# Altium footprint library 1.03-电容.PcbLib: 224 footprints (part 3 of 14)
Each footprint in its own frame and in the unit in brackets; x right, y up, seen from the top. Pads: shape width x height; smd on the part's side, far side on the other; paste and mask are expansions set on the pad; w line width, h text height; cw(c..) or ccw(c..) is an arc to the next point about the centre after c.
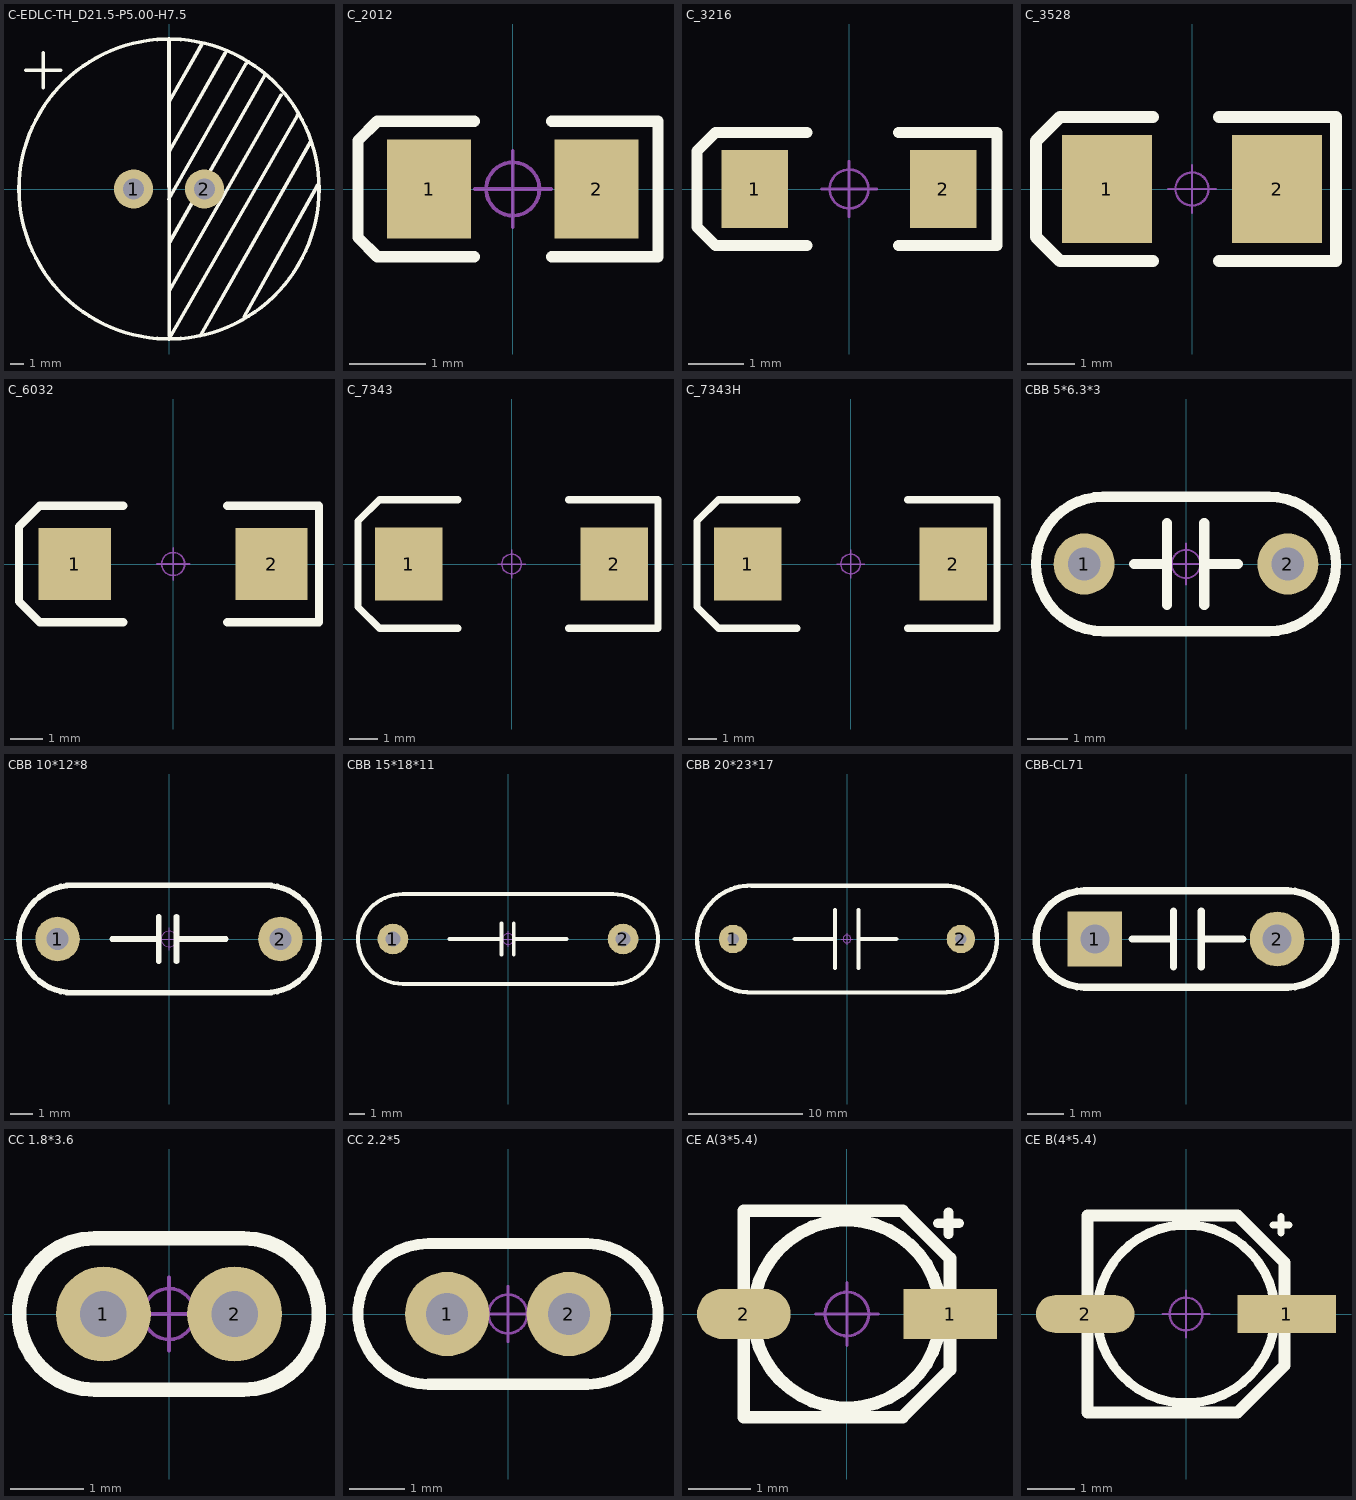
[diagram p2: the footprints below, top view; thin cyan lines are the x and y axes]

## C-EDLC-TH_D21.5-P5.00-H7.5 [mm] "双电层电容器            封装库来自淘宝卖家ID:黄晶宝石"
pads (2):
  round 2.8 hole 1.5: 1(-2.54,0) 2(2.54,0)
Top Overlay:
  circle w0.254: c0,0 r10.75
  lines w0.254: -10.25,8.5 -7.75,8.5 ; -9,7.25 -9,9.75 ; -0.026,-0.735 5.527,8.985 ; 0,-10.75 9.198,5.28 ; 0,6.25 2.385,10.423 ; 0,10.75 0.002,-10.5 ; 0.028,-7.265 8.027,6.735 ; 0.027,2.734 4.027,9.735 ; 0.055,-3.781 6.885,8.173 ; 2.25,-10.5 10.159,3.409 ; 5.379,-9.183 10.666,0.297
3D body "C-EDLC.step": height 7.71, standoff -3.5, extent -10.757,-10.744 10.753,10.744

## C_2012 [mm] "长2.0mm，宽1.25mm，厚1.2mm               联系卖家 免费查找封装"
pads (2):
  rect 1.1x1.3 smd: 1(-1.1,0) 2(1.1,0)
Top Overlay:
  lines w0.15: -0.508,-0.889 -1.778,-0.889 -2.032,-0.635 -2.032,0.254 -2.032,0.635 -1.778,0.889 -0.508,0.889 ; 0.508,-0.889 1.905,-0.889 1.905,0.889 0.508,0.889
Mechanical 15:
  circle w0.05: c0,0 r0.35
  lines w0.05: -0.5,0 0.5,0 ; 0,-0.5 0,0.5
3D body "cd_s_2012_.STEP": height 1.24, standoff 0.04, extent -1,-0.6 1,0.6

## C_3216 [mm] "长3.2mm，宽1.6mm，厚1.6mm"
pads (2):
  rect 1.2x1.4 smd: 1(-1.7,0) 2(1.7,0)
Top Overlay:
  lines w0.2: -0.762,-1.016 -2.413,-1.016 -2.743,-0.686 -2.743,0.686 -2.413,1.016 -0.762,1.016 ; 0.889,-1.016 2.667,-1.016 2.667,1.016 0.889,1.016
Mechanical 15:
  circle w0.05: c0,0 r0.35
  lines w0.05: -0.5,0 0.5,0 ; 0,-0.5 0,0.5
3D body "cd_a_3216__-2 asm.STEP": height 1.63, standoff 0.03, extent -1.6,-0.8 1.6,0.8

## C_3528 [mil] "长3.5mm，宽2.8mm，厚1.9mm             联系卖家 免费查找封装"
pads (2):
  rect 75x90 smd: 1(-70.87,-0.01) 2(70.86,-0.01)
Top Overlay:
  lines w10: -32.51,-60 -110,-60 -130,-40 -130,40 -110,60 -32.51,60 ; 22.49,-60 120,-60 120,60 22.49,60
Mechanical 15:
  circle w1.97: c0,0 r13.78
  lines w1.97: -19.68,0 19.68,0 ; 0,-19.68 0,19.68
3D body "cd_b_3528_.STEP": height 75.84, standoff 1, extent -68.91,-55.11 68.91,55.12

## C_6032 [mm] "长6.0mm，宽3.2mm，厚2.5mm"
pads (2):
  rect 2.2x2.2 smd: 1(-3,0) 2(3,0)
Top Overlay:
  lines w0.254: -1.524,-1.778 -4.064,-1.778 -4.699,-1.143 -4.699,1.143 -4.064,1.778 -1.524,1.778 ; 1.651,-1.778 4.445,-1.778 4.445,1.778 1.651,1.778
Mechanical 15:
  circle w0.05: c0,0 r0.35
  lines w0.05: -0.5,0 0.5,0 ; 0,-0.5 0,0.5
3D body "cd_c_6032_.STEP": height 2.53, standoff 0.03, extent -3,-1.6 3,1.6

## C_7343 [mm] "长7.3mm，宽4.3mm，厚2.8mm"
pads (2):
  rect 2.4x2.6 smd: 1(-3.65,0) 2(3.65,0)
Top Overlay:
  lines w0.254: -1.905,-2.286 -4.699,-2.286 -5.461,-1.524 -5.461,1.524 -4.699,2.286 -1.905,2.286 ; 2.032,-2.286 5.207,-2.286 5.207,2.286 2.032,2.286
Mechanical 15:
  circle w0.05: c0,0 r0.35
  lines w0.05: -0.5,0 0.5,0 ; 0,-0.5 0,0.5
3D body "cd_d_7343h_.STEP": height 2.83, standoff 0.03, extent -3.65,-2.15 3.65,2.15

## C_7343H [mm] "长7.3mm，宽4.3mm，厚4.0mm            联系卖家 免费查找封装"
pads (2):
  rect 2.4x2.6 smd: 1(-3.65,0) 2(3.65,0)
Top Overlay:
  lines w0.254: -1.905,-2.286 -4.699,-2.286 -5.461,-1.524 -5.461,1.524 -4.699,2.286 -1.905,2.286 ; 2.032,-2.286 5.207,-2.286 5.207,2.286 2.032,2.286
Mechanical 15:
  circle w0.05: c0,0 r0.35
  lines w0.05: -0.5,0 0.5,0 ; 0,-0.5 0,0.5
3D body "cd_e_7343h_.STEP": height 4.03, standoff 0.03, extent -3.65,-2.15 3.65,2.15

## CBB 5*6.3*3 [mm] "脚距5mm高6.3mm厚3mm                联系卖家 免费查找封装"
pads (2):
  round 1.5 hole 0.8: 1(-2.5,0) 2(2.5,0)
Top Overlay:
  lines w0.254: -1.27,0 -0.555,0 ; -0.466,-1 -0.466,1 ; 0.445,-1 0.445,1 ; 0.461,0 1.27,0 ; -2.032,-1.651 cw(c-2.032,0) -2.032,1.651 2.032,1.651 cw(c2.032,0) 2.032,-1.651 -2.032,-1.651
Mechanical 15:
  circle w0.05: c0,0 r0.35
  lines w0.05: -0.5,0 0.5,0 ; 0,-0.5 0,0.5
3D body "CBB_6.3x6.3x5.STEP": height 6.8, standoff -3.5, extent -3.15,-1.5 3.15,1.5

## CBB 10*12*8 [mm] "脚距10mm高12mm厚8mm"
pads (2):
  round 2 hole 1: 1(-5,0) 2(5,0)
Top Overlay:
  lines w0.254: -2.54,0 -0.555,0 ; -0.466,-1 -0.466,1 ; 0.334,-1 0.334,1 ; 0.461,0 2.54,0 ; -4.318,-2.413 cw(c-4.318,0) -4.318,2.413 4.318,2.413 cw(c4.318,0) 4.318,-2.413 -4.318,-2.413
Mechanical 15:
  circle w0.05: c0,0 r0.35
  lines w0.05: -0.5,0 0.5,0 ; 0,-0.5 0,0.5
3D body "CBB_10x12x8.STEP": height 9.08, standoff -2.92, extent -5.8,-2.15 6.2,2.35

## CBB 15*18*11 [mm] "脚距15mm高18mm厚11mm"
pads (2):
  round 2 hole 1: 1(-7.5,0) 2(7.5,0)
Top Overlay:
  lines w0.254: -6.858,-2.921 6.858,-2.921 ccw(c6.858,0) 6.857,2.921 -6.858,2.921 ccw(c-6.858,0) -6.857,-2.921 ; -3.81,0 -0.515,0 ; -0.426,-1 -0.426,1 ; 0.374,-1 0.374,1 ; 0.501,0 3.81,0
Mechanical 15:
  circle w0.05: c0,0 r0.35
  lines w0.05: -0.5,0 0.5,0 ; 0,-0.5 0,0.5
3D body "CBB_15x18x11.STEP": height 12.1, standoff -2.9, extent -8.8,-2.55 9.2,2.95

## CBB 20*23*17 [mm] "脚距20mm高23mm厚17mm"
pads (2):
  round 2.5 hole 1: 1(-10,0) 2(10,0)
Top Overlay:
  lines w0.381: -8.382,4.682 8.89,4.682 ; -8.382,4.691 ccw(c-8.476,0) -8.382,-4.691 8.382,-4.691 ccw(c8.476,0) 8.382,4.691 ; -4.572,0 -1.277,0 ; -1.054,-2.54 -1.054,2.54 ; 1.016,-2.54 1.016,2.54 ; 1.016,0 4.318,0
Mechanical 15:
  circle w0.05: c0,0 r0.35
  lines w0.05: -0.5,0 0.5,0 ; 0,-0.5 0,0.5
3D body "CBB_20x23x17.STEP": height 18.91, standoff -2.09, extent -11.525,-4.475 11.475,4.525

## CBB-CL71 [mm] "7.2mm*2.3mm*6.5mm(长*宽*高）           淘宝ID:黄晶宝石"
pads (2):
  rect 1.5x1.5 hole 0.8: 1(-2.5,0)
  round 1.5 hole 0.8: 2(2.5,0)
Top Overlay:
  lines w0.2: -1.484,0 -0.341,0 ; -0.341,-0.762 -0.341,0.762 ; 0.421,-0.762 0.421,0.762 ; 0.421,0 1.564,0 ; -2.794,-1.321 cw(c-2.794,0) -2.794,1.321 2.794,1.321 cw(c2.794,0) 2.794,-1.321 -2.794,-1.321
3D body "CL71-2.STEP": height 2.82, standoff -7.18, extent -3.6,-1.15 3.6,1.15

## CC 1.8*3.6 [mm] "脚距1.8mm直径3.6mm"
pads (2):
  round 1.3 hole 0.635: 1(-0.9,0) 2(0.9,0)
Top Overlay:
  lines w0.2: -1.016,-1.041 cw(c-1.016,0) -1.016,1.041 1.016,1.041 cw(c1.016,0) 1.016,-1.041 -1.016,-1.041
Mechanical 15:
  circle w0.05: c0,0 r0.35
  lines w0.05: -0.5,0 0.5,0 ; 0,-0.5 0,0.5
3D body "CC_1.8x3.6-2.STEP": height 3.83, standoff -3.27, extent -1.825,-0.82 1.775,0.774

## CC 2.2*5 [mil] "脚距2.2mm直径5mm"
height 250
pads (2):
  round 60 hole 30: 1(-43.31,0) 2(43.31,0)
Top Overlay:
  lines w7.87: -56.69,-50.02 cw(c-56.69,0) -56.69,50.02 56.69,50.02 cw(c56.69,0) 56.69,-50.02 -56.69,-49.98
Mechanical 15:
  circle w1.97: c0,0 r13.78
  lines w1.97: -19.68,0 19.68,0 ; 0,-19.68 0,19.68
3D body "CC_2.2x5-2.STEP": height 194.49, standoff -132.28, extent -93.5,-39.81 95.44,32.48

## CE A(3*5.4) [mm] "贴片电解电容，直径3mm，高5.4mm            联系卖家 免费查找封装"
pads (2):
  rect 1.5x0.8 smd: 1(1.651,0)
  oval 1.5x0.8 smd: 2(-1.65,0)
Top Overlay:
  circle w0.203: c0,0 r1.5
  lines w0.152: 1.454,1.45 1.8,1.45 ; 1.625,1.275 1.625,1.625
  lines w0.203: -1.65,-1.65 0.89,-1.65 1.65,-0.89 1.65,0.89 0.89,1.65 -1.65,1.65 -1.65,-1.65
Mechanical 15:
  circle w0.05: c0,0 r0.35
  lines w0.05: -0.5,0 0.5,0 ; 0,-0.5 0,0.5
3D body "CE_SMD_a_3x5_4.STEP": height 5.45, standoff 0.04, extent -1.9,-1.65 1.9,1.65

## CE B(4*5.4) [mm] "贴片电解电容，直径4mm，高5.4mm            联系卖家 免费查找封装"
pads (2):
  rect 2.1x0.8 smd: 1(2.15,0)
  oval 2.1x0.8 smd: 2(-2.15,0)
Top Overlay:
  circle w0.2: c0,0 r1.9
  lines w0.152: 1.854,1.9 2.2,1.9 ; 2.025,1.725 2.025,2.075
  lines w0.254: -2.1,-2.1 -2.1,2.1 1.1,2.1 2.1,1.1 2.1,-1.1 1.1,-2.1 -2.1,-2.1
Mechanical 15:
  circle w0.05: c0,0 r0.35
  lines w0.05: -0.5,0 0.5,0 ; 0,-0.5 0,0.5
3D body "CE_SMD_b_4x5_4.STEP": height 5.45, standoff 0.04, extent -2.3,-2.15 2.3,2.15